# Altium footprint library devices.PCBLIB: 335 footprints (part 4 of 21)
Each footprint in its own frame and in the unit in brackets; x right, y up, seen from the top. Pads: shape width x height; smd on the part's side, far side on the other; paste and mask are expansions set on the pad; w line width, h text height; cw(c..) or ccw(c..) is an arc to the next point about the centre after c.
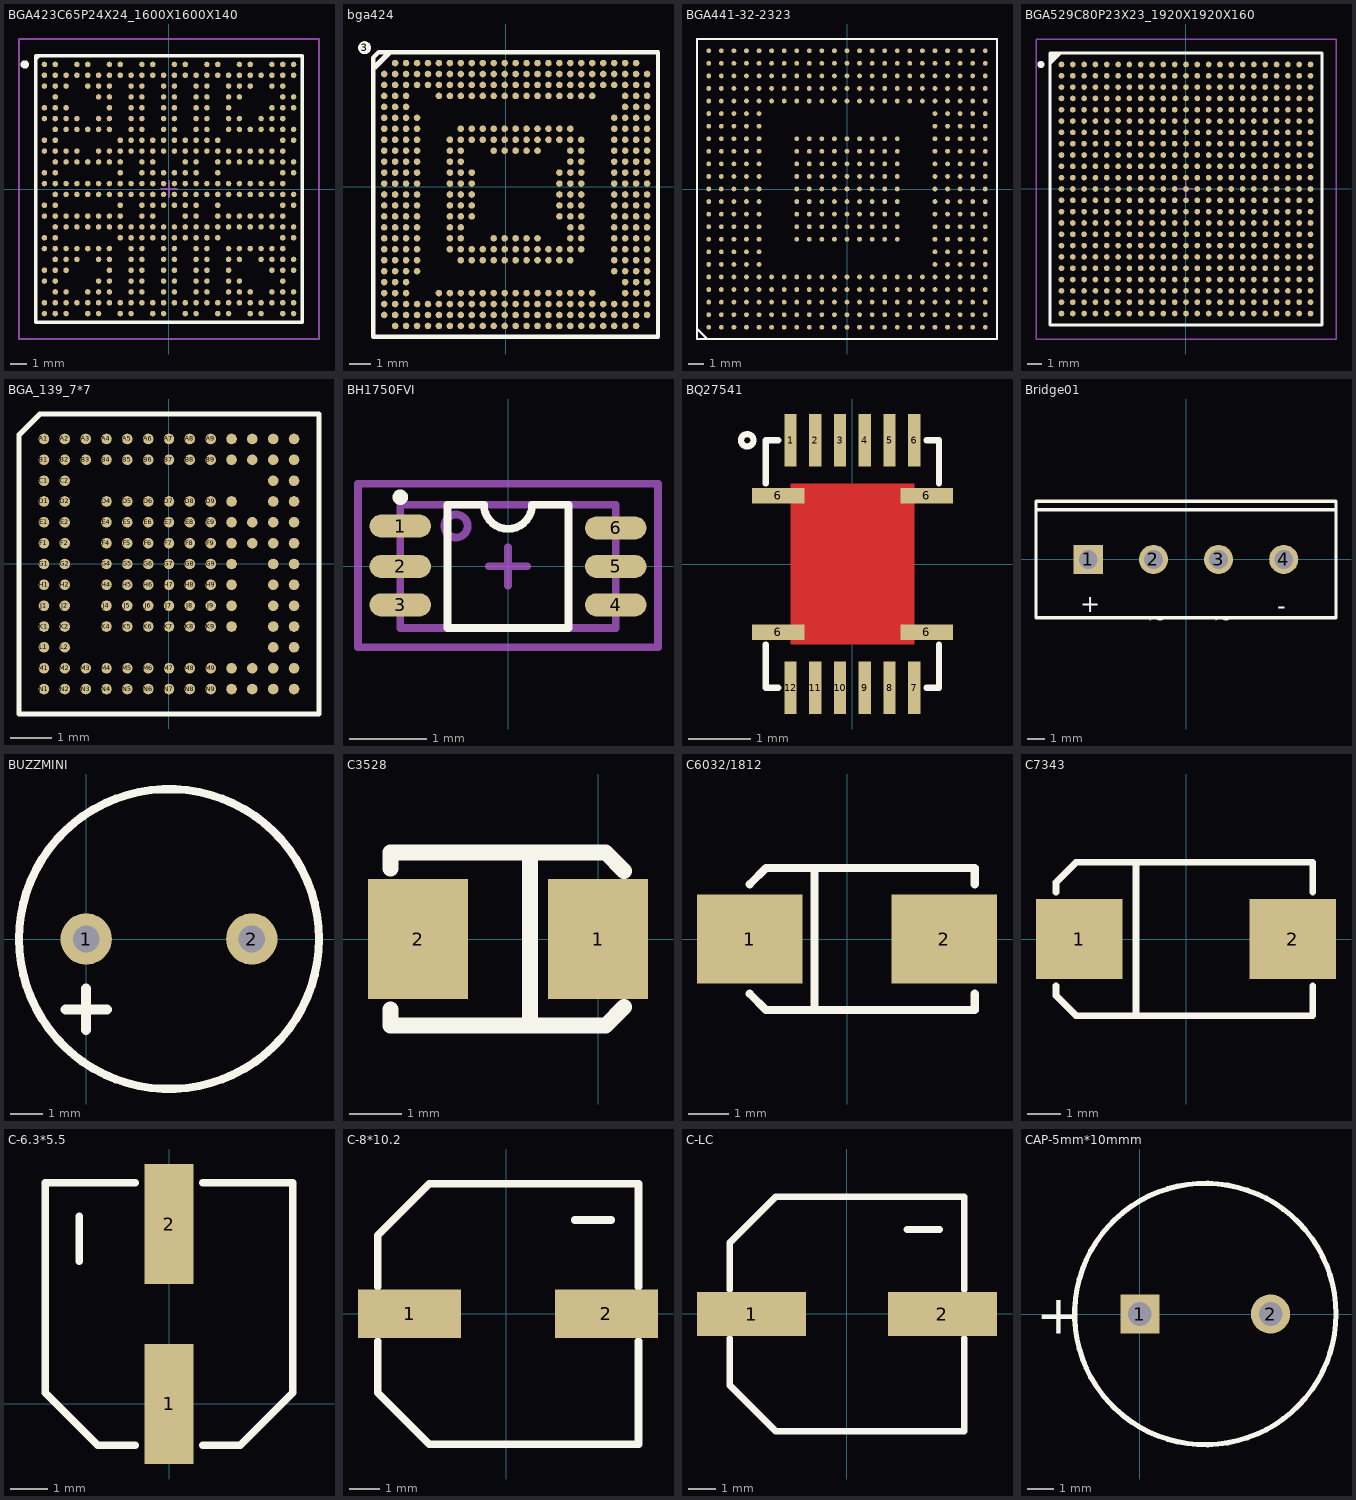
[diagram p3: the footprints below, top view; thin cyan lines are the x and y axes]

## BGA423C65P24X24_1600X1600X140 [mm] "BGA, 423-Leads, Body 16.0x16.0mm,  Pitch 0.65mm"
height 1.4
pads (423):
  round 0.33 smd: A1(-7.475,7.475) A2(-6.825,7.475) A4(-5.525,7.475) A5(-4.875,7.475) A7(-3.575,7.475) A8(-2.925,7.475) A10(-1.625,7.475) A11(-0.975,7.475) A13(0.325,7.475) A14(0.975,7.475) A16(2.275,7.475) A17(2.925,7.475) A19(4.225,7.475) A20(4.875,7.475) A22(6.175,7.475) A23(6.825,7.475) A24(7.475,7.475) AA1(-7.475,-5.525) AA2(-6.825,-5.525) AA6(-4.225,-5.525) AA7(-3.575,-5.525) AA9(-2.275,-5.525) AA10(-1.625,-5.525) AA12(-0.325,-5.525) AA13(0.325,-5.525) AA15(1.625,-5.525) AA16(2.275,-5.525) AA18(3.575,-5.525) AA19(4.225,-5.525) AA23(6.825,-5.525) AB2(-6.825,-6.175) AB3(-6.175,-6.175) AB5(-4.875,-6.175) AB6(-4.225,-6.175) AB7(-3.575,-6.175) AB9(-2.275,-6.175) AB10(-1.625,-6.175) AB12(-0.325,-6.175) AB13(0.325,-6.175) AB15(1.625,-6.175) AB16(2.275,-6.175) AB18(3.575,-6.175) AB19(4.225,-6.175) AB20(4.875,-6.175) AB22(6.175,-6.175) AB23(6.825,-6.175) AB24(7.475,-6.175) AC1(-7.475,-6.825) AC2(-6.825,-6.825) AC3(-6.175,-6.825) AC4(-5.525,-6.825) AC5(-4.875,-6.825) AC6(-4.225,-6.825) AC7(-3.575,-6.825) AC8(-2.925,-6.825) AC9(-2.275,-6.825) AC10(-1.625,-6.825) AC11(-0.975,-6.825) AC12(-0.325,-6.825) AC13(0.325,-6.825) AC14(0.975,-6.825) AC15(1.625,-6.825) AC16(2.275,-6.825) AC17(2.925,-6.825) AC18(3.575,-6.825) AC19(4.225,-6.825) AC20(4.875,-6.825) AC21(5.525,-6.825) AC22(6.175,-6.825) AC23(6.825,-6.825) AC24(7.475,-6.825) AD1(-7.475,-7.475) AD2(-6.825,-7.475) AD3(-6.175,-7.475) AD5(-4.875,-7.475) AD6(-4.225,-7.475) AD8(-2.925,-7.475) AD9(-2.275,-7.475) AD11(-0.975,-7.475) AD12(-0.325,-7.475) AD14(0.975,-7.475) AD15(1.625,-7.475) AD17(2.925,-7.475) AD18(3.575,-7.475) AD20(4.875,-7.475) AD21(5.525,-7.475) AD23(6.825,-7.475) AD24(7.475,-7.475) B1(-7.475,6.825) B2(-6.825,6.825) B3(-6.175,6.825) B4(-5.525,6.825) B5(-4.875,6.825) B6(-4.225,6.825) B7(-3.575,6.825) B8(-2.925,6.825) B9(-2.275,6.825) B10(-1.625,6.825) B11(-0.975,6.825) B12(-0.325,6.825) B13(0.325,6.825) B14(0.975,6.825) B15(1.625,6.825) B16(2.275,6.825) B17(2.925,6.825) B18(3.575,6.825) B19(4.225,6.825) B20(4.875,6.825) B21(5.525,6.825) B22(6.175,6.825) B23(6.825,6.825) B24(7.475,6.825) C1(-7.475,6.175) C2(-6.825,6.175) C3(-6.175,6.175) C5(-4.875,6.175) C6(-4.225,6.175) C7(-3.575,6.175) C9(-2.275,6.175) C10(-1.625,6.175) C12(-0.325,6.175) C13(0.325,6.175) C15(1.625,6.175) C16(2.275,6.175) C18(3.575,6.175) C19(4.225,6.175) C20(4.875,6.175) C22(6.175,6.175) C23(6.825,6.175) D2(-6.825,5.525) D6(-4.225,5.525) D7(-3.575,5.525) D9(-2.275,5.525) D10(-1.625,5.525) D12(-0.325,5.525) D13(0.325,5.525) D15(1.625,5.525) D16(2.275,5.525) D18(3.575,5.525) D19(4.225,5.525) D23(6.825,5.525) D24(7.475,5.525) E1(-7.475,4.875) E2(-6.825,4.875) E3(-6.175,4.875) E7(-3.575,4.875) E9(-2.275,4.875) E10(-1.625,4.875) E12(-0.325,4.875) E13(0.325,4.875) E15(1.625,4.875) E16(2.275,4.875) E18(3.575,4.875) E22(6.175,4.875) E23(6.825,4.875) E24(7.475,4.875) F1(-7.475,4.225) F2(-6.825,4.225) F3(-6.175,4.225) F4(-5.525,4.225) F6(-4.225,4.225) F7(-3.575,4.225) F9(-2.275,4.225) F10(-1.625,4.225) F12(-0.325,4.225) F13(0.325,4.225) F15(1.625,4.225) F16(2.275,4.225) F18(3.575,4.225) F19(4.225,4.225) F21(5.525,4.225) F22(6.175,4.225) F23(6.825,4.225) G2(-6.825,3.575) G3(-6.175,3.575) G4(-5.525,3.575) G5(-4.875,3.575) G6(-4.225,3.575) G7(-3.575,3.575) G9(-2.275,3.575) G10(-1.625,3.575) G12(-0.325,3.575) G13(0.325,3.575) G15(1.625,3.575) G16(2.275,3.575) G18(3.575,3.575) G19(4.225,3.575) G20(4.875,3.575) G21(5.525,3.575) G22(6.175,3.575) G23(6.825,3.575) G24(7.475,3.575) H1(-7.475,2.925) H2(-6.825,2.925) H8(-2.925,2.925) H9(-2.275,2.925) H10(-1.625,2.925) H11(-0.975,2.925) H12(-0.325,2.925) H13(0.325,2.925) H14(0.975,2.925) H15(1.625,2.925) H16(2.275,2.925) H17(2.925,2.925) H23(6.825,2.925) H24(7.475,2.925) J1(-7.475,2.275) J2(-6.825,2.275) J3(-6.175,2.275) J4(-5.525,2.275) J6(-4.225,2.275) J7(-3.575,2.275) J8(-2.925,2.275) J9(-2.275,2.275) J10(-1.625,2.275) J11(-0.975,2.275) J12(-0.325,2.275) J13(0.325,2.275) J14(0.975,2.275) J15(1.625,2.275) J16(2.275,2.275) J17(2.925,2.275) J18(3.575,2.275) J19(4.225,2.275) J20(4.875,2.275) J21(5.525,2.275) J22(6.175,2.275) J23(6.825,2.275) K2(-6.825,1.625) K3(-6.175,1.625) K4(-5.525,1.625) K5(-4.875,1.625) K6(-4.225,1.625) K7(-3.575,1.625) K8(-2.925,1.625) K10(-1.625,1.625) K11(-0.975,1.625) K14(0.975,1.625) K15(1.625,1.625) K17(2.925,1.625) K18(3.575,1.625) K19(4.225,1.625) K20(4.875,1.625) K21(5.525,1.625) K22(6.175,1.625) K23(6.825,1.625) K24(7.475,1.625) L1(-7.475,0.975) L2(-6.825,0.975) L8(-2.925,0.975) L10(-1.625,0.975) L11(-0.975,0.975) L12(-0.325,0.975) L13(0.325,0.975) L14(0.975,0.975) L15(1.625,0.975) L17(2.925,0.975) L23(6.825,0.975) L24(7.475,0.975) M1(-7.475,0.325) M2(-6.825,0.325) M3(-6.175,0.325) M4(-5.525,0.325) M5(-4.875,0.325) M6(-4.225,0.325) M7(-3.575,0.325) M8(-2.925,0.325) M9(-2.275,0.325) M10(-1.625,0.325) M11(-0.975,0.325) M12(-0.325,0.325) M13(0.325,0.325) M14(0.975,0.325) M15(1.625,0.325) M16(2.275,0.325) M17(2.925,0.325) M18(3.575,0.325) M19(4.225,0.325) M20(4.875,0.325) M21(5.525,0.325) M22(6.175,0.325) M23(6.825,0.325) N2(-6.825,-0.325) N3(-6.175,-0.325) N4(-5.525,-0.325) N5(-4.875,-0.325) N6(-4.225,-0.325) N7(-3.575,-0.325) N8(-2.925,-0.325) N9(-2.275,-0.325) N10(-1.625,-0.325) N11(-0.975,-0.325) N12(-0.325,-0.325) N13(0.325,-0.325) N14(0.975,-0.325) N15(1.625,-0.325) N16(2.275,-0.325) N17(2.925,-0.325) N18(3.575,-0.325) N19(4.225,-0.325) N20(4.875,-0.325) N21(5.525,-0.325) N22(6.175,-0.325) N23(6.825,-0.325) N24(7.475,-0.325) P1(-7.475,-0.975) P2(-6.825,-0.975) P8(-2.925,-0.975) P10(-1.625,-0.975) P11(-0.975,-0.975) P12(-0.325,-0.975) P13(0.325,-0.975) P14(0.975,-0.975) P15(1.625,-0.975) P17(2.925,-0.975) P23(6.825,-0.975) P24(7.475,-0.975) R1(-7.475,-1.625) R2(-6.825,-1.625) R3(-6.175,-1.625) R4(-5.525,-1.625) R5(-4.875,-1.625) R6(-4.225,-1.625) R7(-3.575,-1.625) R8(-2.925,-1.625) R10(-1.625,-1.625) R11(-0.975,-1.625) R14(0.975,-1.625) R15(1.625,-1.625) R17(2.925,-1.625) R18(3.575,-1.625) R19(4.225,-1.625) R20(4.875,-1.625) R21(5.525,-1.625) R22(6.175,-1.625) R23(6.825,-1.625) T2(-6.825,-2.275) T3(-6.175,-2.275) T4(-5.525,-2.275) T5(-4.875,-2.275) T6(-4.225,-2.275) T7(-3.575,-2.275) T8(-2.925,-2.275) T9(-2.275,-2.275) T10(-1.625,-2.275) T11(-0.975,-2.275) T12(-0.325,-2.275) T13(0.325,-2.275) T14(0.975,-2.275) T15(1.625,-2.275) T16(2.275,-2.275) T17(2.925,-2.275) T18(3.575,-2.275) T19(4.225,-2.275) T20(4.875,-2.275) T21(5.525,-2.275) T22(6.175,-2.275) T23(6.825,-2.275) T24(7.475,-2.275) U1(-7.475,-2.925) U2(-6.825,-2.925) U8(-2.925,-2.925) U9(-2.275,-2.925) U10(-1.625,-2.925) U11(-0.975,-2.925) U12(-0.325,-2.925) U13(0.325,-2.925) U14(0.975,-2.925) U15(1.625,-2.925) U16(2.275,-2.925) U17(2.925,-2.925) U23(6.825,-2.925) U24(7.475,-2.925) V1(-7.475,-3.575) V2(-6.825,-3.575) V3(-6.175,-3.575) V4(-5.525,-3.575) V5(-4.875,-3.575) V6(-4.225,-3.575) V7(-3.575,-3.575) V9(-2.275,-3.575) V10(-1.625,-3.575) V12(-0.325,-3.575) V13(0.325,-3.575) V15(1.625,-3.575) V16(2.275,-3.575) V18(3.575,-3.575) V19(4.225,-3.575) V20(4.875,-3.575) V21(5.525,-3.575) V22(6.175,-3.575) V23(6.825,-3.575) W2(-6.825,-4.225) W3(-6.175,-4.225) W4(-5.525,-4.225) W6(-4.225,-4.225) W7(-3.575,-4.225) W9(-2.275,-4.225) W10(-1.625,-4.225) W12(-0.325,-4.225) W13(0.325,-4.225) W15(1.625,-4.225) W16(2.275,-4.225) W18(3.575,-4.225) W19(4.225,-4.225) W21(5.525,-4.225) W22(6.175,-4.225) W23(6.825,-4.225) W24(7.475,-4.225) Y1(-7.475,-4.875) Y2(-6.825,-4.875) Y3(-6.175,-4.875) Y7(-3.575,-4.875) Y9(-2.275,-4.875) Y10(-1.625,-4.875) Y12(-0.325,-4.875) Y13(0.325,-4.875) Y15(1.625,-4.875) Y16(2.275,-4.875) Y18(3.575,-4.875) Y22(6.175,-4.875) Y23(6.825,-4.875) Y24(7.475,-4.875)
Top Overlay:
  circle w0.25: c-8.65,7.475 r0.125
  region: -7.799,8 -8,7.799 -8,8
  lines w0.2: -8,7.799 -7.799,8 ; -8,-8 -8,8 8,8 8,-8 -8,-8
Mechanical 13:
  lines w0.1: -8,-8 -8,8 8,8 8,-8 -8,-8
Mechanical 15:
  lines w0.1: -0.5,0 0.5,0 ; 0,-0.5 0,0.5 ; -9,-9 -9,9 9,9 9,-9 -9,-9
3D body: height 1.4, standoff 0.27, extent -8,-8 8,8

## bga424 [mm]
pads (425):
  round 0.6 on Top Overlay: 3(-6.447,6.351)
  round 0.3 smd: A2(-5.053,5.649) A3(-4.553,5.649) A4(-4.053,5.649) A5(-3.553,5.649) A6(-3.053,5.649) A7(-2.553,5.649) A8(-2.053,5.649) A9(-1.553,5.649) A10(-1.053,5.649) A11(-0.553,5.649) A12(-0.053,5.649) A13(0.447,5.649) A14(0.947,5.649) A15(1.447,5.649) A16(1.947,5.649) A17(2.447,5.649) A18(2.947,5.649) A19(3.447,5.649) A20(3.947,5.649) A21(4.447,5.649) A22(4.947,5.649) A23(5.447,5.649) A24(5.947,5.649) AA1(-5.553,-4.351) AA2(-5.053,-4.351) AA3(-4.553,-4.351) AA23(5.447,-4.351) AA24(5.947,-4.351) AA25(6.447,-4.351) AB1(-5.553,-4.851) AB2(-5.053,-4.851) AB3(-4.553,-4.851) AB6(-3.053,-4.851) AB7(-2.553,-4.851) AB8(-2.053,-4.851) AB9(-1.553,-4.851) AB10(-1.053,-4.851) AB11(-0.553,-4.851) AB12(-0.053,-4.851) AB13(0.447,-4.851) AB14(0.947,-4.851) AB15(1.447,-4.851) AB16(1.947,-4.851) AB17(2.447,-4.851) AB18(2.947,-4.851) AB19(3.447,-4.851) AB20(3.947,-4.851) AB23(5.447,-4.851) AB24(5.947,-4.851) AB25(6.447,-4.851) AC1(-5.553,-5.351) AC2(-5.053,-5.351) AC3(-4.553,-5.351) AC4(-4.053,-5.351) AC5(-3.553,-5.351) AC6(-3.053,-5.351) AC7(-2.553,-5.351) AC8(-2.053,-5.351) AC9(-1.553,-5.351) AC10(-1.053,-5.351) AC11(-0.553,-5.351) AC12(-0.053,-5.351) AC13(0.447,-5.351) AC14(0.947,-5.351) AC15(1.447,-5.351) AC16(1.947,-5.351) AC17(2.447,-5.351) AC18(2.947,-5.351) AC19(3.447,-5.351) AC20(3.947,-5.351) AC21(4.447,-5.351) AC22(4.947,-5.351) AC23(5.447,-5.351) AC24(5.947,-5.351) AC25(6.447,-5.351) AD1(-5.553,-5.851) AD2(-5.053,-5.851) AD3(-4.553,-5.851) AD4(-4.053,-5.851) AD5(-3.553,-5.851) AD6(-3.053,-5.851) AD7(-2.553,-5.851) AD8(-2.053,-5.851) AD9(-1.553,-5.851) AD10(-1.053,-5.851) AD11(-0.553,-5.851) AD12(-0.053,-5.851) AD13(0.447,-5.851) AD14(0.947,-5.851) AD15(1.447,-5.851) AD16(1.947,-5.851) AD17(2.447,-5.851) AD18(2.947,-5.851) AD19(3.447,-5.851) AD20(3.947,-5.851) AD21(4.447,-5.851) AD22(4.947,-5.851) AD23(5.447,-5.851) AD24(5.947,-5.851) AD25(6.447,-5.851) AE2(-5.053,-6.351) AE3(-4.553,-6.351) AE4(-4.053,-6.351) AE5(-3.553,-6.351) AE6(-3.053,-6.351) AE7(-2.553,-6.351) AE8(-2.053,-6.351) AE9(-1.553,-6.351) AE10(-1.053,-6.351) AE11(-0.553,-6.351) AE12(-0.053,-6.351) AE13(0.447,-6.351) AE14(0.947,-6.351) AE15(1.447,-6.351) AE16(1.947,-6.351) AE17(2.447,-6.351) AE18(2.947,-6.351) AE19(3.447,-6.351) AE20(3.947,-6.351) AE21(4.447,-6.351) AE22(4.947,-6.351) AE23(5.447,-6.351) AE24(5.947,-6.351) B1(-5.553,5.149) B2(-5.053,5.149) B3(-4.553,5.149) B4(-4.053,5.149) B5(-3.553,5.149) B6(-3.053,5.149) B7(-2.553,5.149) B8(-2.053,5.149) B9(-1.553,5.149) B10(-1.053,5.149) B11(-0.553,5.149) B12(-0.053,5.149) B13(0.447,5.149) B14(0.947,5.149) B15(1.447,5.149) B16(1.947,5.149) B17(2.447,5.149) B18(2.947,5.149) B19(3.447,5.149) B20(3.947,5.149) B21(4.447,5.149) B22(4.947,5.149) B23(5.447,5.149) B24(5.947,5.149) B25(6.447,5.149) C1(-5.553,4.649) C2(-5.053,4.649) C3(-4.553,4.649) C4(-4.053,4.649) C5(-3.553,4.649) C6(-3.053,4.649) C7(-2.553,4.649) C8(-2.053,4.649) C9(-1.553,4.649) C10(-1.053,4.649) C11(-0.553,4.649) C12(-0.053,4.649) C13(0.447,4.649) C14(0.947,4.649) C15(1.447,4.649) C16(1.947,4.649) C17(2.447,4.649) C18(2.947,4.649) C19(3.447,4.649) C20(3.947,4.649) C21(4.447,4.649) C22(4.947,4.649) C23(5.447,4.649) C24(5.947,4.649) C25(6.447,4.649) D1(-5.553,4.149) D2(-5.053,4.149) D3(-4.553,4.149) D6(-3.053,4.149) D7(-2.553,4.149) D8(-2.053,4.149) D9(-1.553,4.149) D10(-1.053,4.149) D11(-0.553,4.149) D12(-0.053,4.149) D13(0.447,4.149) D14(0.947,4.149) D15(1.447,4.149) D16(1.947,4.149) D17(2.447,4.149) D18(2.947,4.149) D19(3.447,4.149) D20(3.947,4.149) D23(5.447,4.149) D24(5.947,4.149) D25(6.447,4.149) E1(-5.553,3.649) E2(-5.053,3.649) E3(-4.553,3.649) E23(5.447,3.649) E24(5.947,3.649) E25(6.447,3.649) F1(-5.553,3.149) F2(-5.053,3.149) F3(-4.553,3.149) F4(-4.053,3.149) F22(4.947,3.149) F23(5.447,3.149) F24(5.947,3.149) F25(6.447,3.149) G1(-5.553,2.649) G2(-5.053,2.649) G3(-4.553,2.649) G4(-4.053,2.649) G8(-2.053,2.649) G9(-1.553,2.649) G10(-1.053,2.649) G11(-0.553,2.649) G12(-0.053,2.649) G13(0.447,2.649) G14(0.947,2.649) G15(1.447,2.649) G16(1.947,2.649) G17(2.447,2.649) G18(2.947,2.649) G22(4.947,2.649) G23(5.447,2.649) G24(5.947,2.649) G25(6.447,2.649) H1(-5.553,2.149) H2(-5.053,2.149) H3(-4.553,2.149) H4(-4.053,2.149) H7(-2.553,2.149) H8(-2.053,2.149) H9(-1.553,2.149) H10(-1.053,2.149) H11(-0.553,2.149) H12(-0.053,2.149) H13(0.447,2.149) H14(0.947,2.149) H15(1.447,2.149) H16(1.947,2.149) H17(2.447,2.149) H18(2.947,2.149) H19(3.447,2.149) H22(4.947,2.149) H23(5.447,2.149) H24(5.947,2.149) H25(6.447,2.149) J1(-5.553,1.649) J2(-5.053,1.649) J3(-4.553,1.649) J4(-4.053,1.649) J7(-2.553,1.649) J8(-2.053,1.649) J11(-0.553,1.649) J12(-0.053,1.649) J13(0.447,1.649) J14(0.947,1.649) J15(1.447,1.649) J18(2.947,1.649) J19(3.447,1.649) J22(4.947,1.649) J23(5.447,1.649) J24(5.947,1.649) J25(6.447,1.649) K1(-5.553,1.149) K2(-5.053,1.149) K3(-4.553,1.149) K4(-4.053,1.149) K7(-2.553,1.149) K8(-2.053,1.149) K18(2.947,1.149) K19(3.447,1.149) K22(4.947,1.149) K23(5.447,1.149) K24(5.947,1.149) K25(6.447,1.149) L1(-5.553,0.649) L2(-5.053,0.649) L3(-4.553,0.649) L4(-4.053,0.649) L7(-2.553,0.649) L8(-2.053,0.649) L9(-1.553,0.649) L17(2.447,0.649) L18(2.947,0.649) L19(3.447,0.649) L22(4.947,0.649) L23(5.447,0.649) L24(5.947,0.649) L25(6.447,0.649) M1(-5.553,0.149) M2(-5.053,0.149) M3(-4.553,0.149) M4(-4.053,0.149) M7(-2.553,0.149) M8(-2.053,0.149) M9(-1.553,0.149) M17(2.447,0.149) M18(2.947,0.149) M19(3.447,0.149) M22(4.947,0.149) M23(5.447,0.149) M24(5.947,0.149) M25(6.447,0.149) N1(-5.553,-0.351) N2(-5.053,-0.351) N3(-4.553,-0.351) N4(-4.053,-0.351) N7(-2.553,-0.351) N8(-2.053,-0.351) N9(-1.553,-0.351) N17(2.447,-0.351) N18(2.947,-0.351) N19(3.447,-0.351) N22(4.947,-0.351) N23(5.447,-0.351) N24(5.947,-0.351) N25(6.447,-0.351) P1(-5.553,-0.851) P2(-5.053,-0.851) P3(-4.553,-0.851) P4(-4.053,-0.851) P7(-2.553,-0.851) P8(-2.053,-0.851) P9(-1.553,-0.851) P17(2.447,-0.851) P18(2.947,-0.851) P19(3.447,-0.851) P22(4.947,-0.851) P23(5.447,-0.851) P24(5.947,-0.851) P25(6.447,-0.851) R1(-5.553,-1.351) R2(-5.053,-1.351) R3(-4.553,-1.351) R4(-4.053,-1.351) R7(-2.553,-1.351) R8(-2.053,-1.351) R9(-1.553,-1.351) R17(2.447,-1.351) R18(2.947,-1.351) R19(3.447,-1.351) R22(4.947,-1.351) R23(5.447,-1.351) R24(5.947,-1.351) R25(6.447,-1.351) T1(-5.553,-1.851) T2(-5.053,-1.851) T3(-4.553,-1.851) T4(-4.053,-1.851) T7(-2.553,-1.851) T8(-2.053,-1.851) T18(2.947,-1.851) T19(3.447,-1.851) T22(4.947,-1.851) T23(5.447,-1.851) T24(5.947,-1.851) T25(6.447,-1.851) U1(-5.553,-2.351) U2(-5.053,-2.351) U3(-4.553,-2.351) U4(-4.053,-2.351) U7(-2.553,-2.351) U8(-2.053,-2.351) U11(-0.553,-2.351) U12(-0.053,-2.351) U13(0.447,-2.351) U14(0.947,-2.351) U15(1.447,-2.351) U18(2.947,-2.351) U19(3.447,-2.351) U22(4.947,-2.351) U23(5.447,-2.351) U24(5.947,-2.351) U25(6.447,-2.351) V1(-5.553,-2.851) V2(-5.053,-2.851) V3(-4.553,-2.851) V4(-4.053,-2.851) V7(-2.553,-2.851) V8(-2.053,-2.851) V9(-1.553,-2.851) V10(-1.053,-2.851) V11(-0.553,-2.851) V12(-0.053,-2.851) V13(0.447,-2.851) V14(0.947,-2.851) V15(1.447,-2.851) V16(1.947,-2.851) V17(2.447,-2.851) V18(2.947,-2.851) V19(3.447,-2.851) V22(4.947,-2.851) V23(5.447,-2.851) V24(5.947,-2.851) V25(6.447,-2.851) W1(-5.553,-3.351) W2(-5.053,-3.351) W3(-4.553,-3.351) W4(-4.053,-3.351) W8(-2.053,-3.351) W9(-1.553,-3.351) W10(-1.053,-3.351) W11(-0.553,-3.351) W12(-0.053,-3.351) W13(0.447,-3.351) W14(0.947,-3.351) W15(1.447,-3.351) W16(1.947,-3.351) W17(2.447,-3.351) W18(2.947,-3.351) W22(4.947,-3.351) W23(5.447,-3.351) W24(5.947,-3.351) W25(6.447,-3.351) Y1(-5.553,-3.851) Y2(-5.053,-3.851) Y3(-4.553,-3.851) Y4(-4.053,-3.851) Y22(4.947,-3.851) Y23(5.447,-3.851) Y24(5.947,-3.851) Y25(6.447,-3.851)
Top Overlay:
  lines w0.2: -6.053,-6.851 6.947,-6.851 6.947,6.149 -5.803,6.149 -6.053,5.899 -6.053,-6.851
  lines w0.254: -5.997,5.451 -5.334,6.113

## BGA441-32-2323 [mil] "BGA441-32-2323"
pads (441):
  round 12 smd: A1(-346.46,-346.46) A2(-346.46,-314.96) A3(-346.46,-283.46) A4(-346.46,-251.97) A5(-346.46,-220.47) A6(-346.46,-188.98) A7(-346.46,-157.48) A8(-346.46,-125.98) A9(-346.46,-94.49) A10(-346.46,-62.99) A11(-346.46,-31.5) A12(-346.46,0) A13(-346.46,31.5) A14(-346.46,62.99) A15(-346.46,94.49) A16(-346.46,125.98) A17(-346.46,157.48) A18(-346.46,188.98) A19(-346.46,220.47) A20(-346.46,251.97) A21(-346.46,283.46) A22(-346.46,314.96) A23(-346.46,346.46) AA1(283.46,-346.46) AA2(283.46,-314.96) AA3(283.46,-283.46) AA4(283.46,-251.97) AA5(283.46,-220.47) AA6(283.46,-188.98) AA7(283.46,-157.48) AA8(283.46,-125.98) AA9(283.46,-94.49) AA10(283.46,-62.99) AA11(283.46,-31.5) AA12(283.46,0) AA13(283.46,31.5) AA14(283.46,62.99) AA15(283.46,94.49) AA16(283.46,125.98) AA17(283.46,157.48) AA18(283.46,188.98) AA19(283.46,220.47) AA20(283.46,251.97) AA21(283.46,283.46) AA22(283.46,314.96) AA23(283.46,346.46) AB1(314.96,-346.46) AB2(314.96,-314.96) AB3(314.96,-283.46) AB4(314.96,-251.97) AB5(314.96,-220.47) AB6(314.96,-188.98) AB7(314.96,-157.48) AB8(314.96,-125.98) AB9(314.96,-94.49) AB10(314.96,-62.99) AB11(314.96,-31.5) AB12(314.96,0) AB13(314.96,31.5) AB14(314.96,62.99) AB15(314.96,94.49) AB16(314.96,125.98) AB17(314.96,157.48) AB18(314.96,188.98) AB19(314.96,220.47) AB20(314.96,251.97) AB21(314.96,283.46) AB22(314.96,314.96) AB23(314.96,346.46) AC1(346.46,-346.46) AC2(346.46,-314.96) AC3(346.46,-283.46) AC4(346.46,-251.97) AC5(346.46,-220.47) AC6(346.46,-188.98) AC7(346.46,-157.48) AC8(346.46,-125.98) AC9(346.46,-94.49) AC10(346.46,-62.99) AC11(346.46,-31.5) AC12(346.46,0) AC13(346.46,31.5) AC14(346.46,62.99) AC15(346.46,94.49) AC16(346.46,125.98) AC17(346.46,157.48) AC18(346.46,188.98) AC19(346.46,220.47) AC20(346.46,251.97) AC21(346.46,283.46) AC22(346.46,314.96) AC23(346.46,346.46) B1(-314.96,-346.46) B2(-314.96,-314.96) B3(-314.96,-283.46) B4(-314.96,-251.97) B5(-314.96,-220.47) B6(-314.96,-188.98) B7(-314.96,-157.48) B8(-314.96,-125.98) B9(-314.96,-94.49) B10(-314.96,-62.99) B11(-314.96,-31.5) B12(-314.96,0) B13(-314.96,31.5) B14(-314.96,62.99) B15(-314.96,94.49) B16(-314.96,125.98) B17(-314.96,157.48) B18(-314.96,188.98) B19(-314.96,220.47) B20(-314.96,251.97) B21(-314.96,283.46) B22(-314.96,314.96) B23(-314.96,346.46) C1(-283.46,-346.46) C2(-283.46,-314.96) C3(-283.46,-283.46) C4(-283.46,-251.97) C5(-283.46,-220.47) C6(-283.46,-188.98) C7(-283.46,-157.48) C8(-283.46,-125.98) C9(-283.46,-94.49) C10(-283.46,-62.99) C11(-283.46,-31.5) C12(-283.46,0) C13(-283.46,31.5) C14(-283.46,62.99) C15(-283.46,94.49) C16(-283.46,125.98) C17(-283.46,157.48) C18(-283.46,188.98) C19(-283.46,220.47) C20(-283.46,251.97) C21(-283.46,283.46) C22(-283.46,314.96) C23(-283.46,346.46) D1(-251.97,-346.46) D2(-251.97,-314.96) D3(-251.97,-283.46) D4(-251.97,-251.97) D5(-251.97,-220.47) D6(-251.97,-188.98) D7(-251.97,-157.48) D8(-251.97,-125.98) D9(-251.97,-94.49) D10(-251.97,-62.99) D11(-251.97,-31.5) D12(-251.97,0) D13(-251.97,31.5) D14(-251.97,62.99) D15(-251.97,94.49) D16(-251.97,125.98) D17(-251.97,157.48) D18(-251.97,188.98) D19(-251.97,220.47) D20(-251.97,251.97) D21(-251.97,283.46) D22(-251.97,314.96) D23(-251.97,346.46) E1(-220.47,-346.46) E2(-220.47,-314.96) E3(-220.47,-283.46) E4(-220.47,-251.97) E5(-220.47,-220.47) E6(-220.47,-188.98) E7(-220.47,-157.48) E8(-220.47,-125.98) E9(-220.47,-94.49) E10(-220.47,-62.99) E11(-220.47,-31.5) E12(-220.47,0) E13(-220.47,31.5) E14(-220.47,62.99) E15(-220.47,94.49) E16(-220.47,125.98) E17(-220.47,157.48) E18(-220.47,188.98) E19(-220.47,220.47) E20(-220.47,251.97) E21(-220.47,283.46) E22(-220.47,314.96) E23(-220.47,346.46) F1(-188.98,-346.46) F2(-188.98,-314.96) F3(-188.98,-283.46) F4(-188.98,-251.97) F5(-188.98,-220.47) F19(-188.98,220.47) F20(-188.98,251.97) F21(-188.98,283.46) F22(-188.98,314.96) F23(-188.98,346.46) G1(-157.48,-346.46) G2(-157.48,-314.96) G3(-157.48,-283.46) G4(-157.48,-251.97) G5(-157.48,-220.47) G19(-157.48,220.47) G20(-157.48,251.97) G21(-157.48,283.46) G22(-157.48,314.96) G23(-157.48,346.46) H1(-125.98,-346.46) H2(-125.98,-314.96) H3(-125.98,-283.46) H4(-125.98,-251.97) H5(-125.98,-220.47) H8(-125.98,-125.98) H9(-125.98,-94.49) H10(-125.98,-62.99) H11(-125.98,-31.5) H12(-125.98,0) H13(-125.98,31.5) H14(-125.98,62.99) H15(-125.98,94.49) H16(-125.98,125.98) H19(-125.98,220.47) H20(-125.98,251.97) H21(-125.98,283.46) H22(-125.98,314.96) H23(-125.98,346.46) J1(-94.49,-346.46) J2(-94.49,-314.96) J3(-94.49,-283.46) J4(-94.49,-251.97) J5(-94.49,-220.47) J8(-94.49,-125.98) J9(-94.49,-94.49) J10(-94.49,-62.99) J11(-94.49,-31.5) J12(-94.49,0) J13(-94.49,31.5) J14(-94.49,62.99) J15(-94.49,94.49) J16(-94.49,125.98) J19(-94.49,220.47) J20(-94.49,251.97) J21(-94.49,283.46) J22(-94.49,314.96) J23(-94.49,346.46) K1(-62.99,-346.46) K2(-62.99,-314.96) K3(-62.99,-283.46) K4(-62.99,-251.97) K5(-62.99,-220.47) K8(-62.99,-125.98) K9(-62.99,-94.49) K10(-62.99,-62.99) K11(-62.99,-31.5) K12(-62.99,0) K13(-62.99,31.5) K14(-62.99,62.99) K15(-62.99,94.49) K16(-62.99,125.98) K19(-62.99,220.47) K20(-62.99,251.97) K21(-62.99,283.46) K22(-62.99,314.96) K23(-62.99,346.46) L1(-31.5,-346.46) L2(-31.5,-314.96) L3(-31.5,-283.46) L4(-31.5,-251.97) L5(-31.5,-220.47) L8(-31.5,-125.98) L9(-31.5,-94.49) L10(-31.5,-62.99) L11(-31.5,-31.5) L12(-31.5,0) L13(-31.5,31.5) L14(-31.5,62.99) L15(-31.5,94.49) L16(-31.5,125.98) L19(-31.5,220.47) L20(-31.5,251.97) L21(-31.5,283.46) L22(-31.5,314.96) L23(-31.5,346.46) M1(0,-346.46) M2(0,-314.96) M3(0,-283.46) M4(0,-251.97) M5(0,-220.47) M8(0,-125.98) M9(0,-94.49) M10(0,-62.99) M11(0,-31.5) M12(0,0) M13(0,31.5) M14(0,62.99) M15(0,94.49) M16(0,125.98) M19(0,220.47) M20(0,251.97) M21(0,283.46) M22(0,314.96) M23(0,346.46) N1(31.5,-346.46) N2(31.5,-314.96) N3(31.5,-283.46) N4(31.5,-251.97) N5(31.5,-220.47) N8(31.5,-125.98) N9(31.5,-94.49) N10(31.5,-62.99) N11(31.5,-31.5) N12(31.5,0) N13(31.5,31.5) N14(31.5,62.99) N15(31.5,94.49) N16(31.5,125.98) N19(31.5,220.47) N20(31.5,251.97) N21(31.5,283.46) N22(31.5,314.96) N23(31.5,346.46) P1(62.99,-346.46) P2(62.99,-314.96) P3(62.99,-283.46) P4(62.99,-251.97) P5(62.99,-220.47) P8(62.99,-125.98) P9(62.99,-94.49) P10(62.99,-62.99) P11(62.99,-31.5) P12(62.99,0) P13(62.99,31.5) P14(62.99,62.99) P15(62.99,94.49) P16(62.99,125.98) P19(62.99,220.47) P20(62.99,251.97) P21(62.99,283.46) P22(62.99,314.96) P23(62.99,346.46) R1(94.49,-346.46) R2(94.49,-314.96) R3(94.49,-283.46) R4(94.49,-251.97) R5(94.49,-220.47) R8(94.49,-125.98) R9(94.49,-94.49) R10(94.49,-62.99) R11(94.49,-31.5) R12(94.49,0) R13(94.49,31.5) R14(94.49,62.99) R15(94.49,94.49) R16(94.49,125.98) R19(94.49,220.47) R20(94.49,251.97) R21(94.49,283.46) R22(94.49,314.96) R23(94.49,346.46) T1(125.98,-346.46) T2(125.98,-314.96) T3(125.98,-283.46) T4(125.98,-251.97) T5(125.98,-220.47) T8(125.98,-125.98) T9(125.98,-94.49) T10(125.98,-62.99) T11(125.98,-31.5) T12(125.98,0) T13(125.98,31.5) T14(125.98,62.99) T15(125.98,94.49) T16(125.98,125.98) T19(125.98,220.47) T20(125.98,251.97) T21(125.98,283.46) T22(125.98,314.96) T23(125.98,346.46) U1(157.48,-346.46) U2(157.48,-314.96) U3(157.48,-283.46) U4(157.48,-251.97) U5(157.48,-220.47) U19(157.48,220.47) U20(157.48,251.97) U21(157.48,283.46) U22(157.48,314.96) U23(157.48,346.46) V1(188.98,-346.46) V2(188.98,-314.96) V3(188.98,-283.46) V4(188.98,-251.97) V5(188.98,-220.47) V19(188.98,220.47) V20(188.98,251.97) V21(188.98,283.46) V22(188.98,314.96) V23(188.98,346.46) W1(220.47,-346.46) W2(220.47,-314.96) W3(220.47,-283.46) W4(220.47,-251.97) W5(220.47,-220.47) W6(220.47,-188.98) W7(220.47,-157.48) W8(220.47,-125.98) W9(220.47,-94.49) W10(220.47,-62.99) W11(220.47,-31.5) W12(220.47,0) W13(220.47,31.5) W14(220.47,62.99) W15(220.47,94.49) W16(220.47,125.98) W17(220.47,157.48) W18(220.47,188.98) W19(220.47,220.47) W20(220.47,251.97) W21(220.47,283.46) W22(220.47,314.96) W23(220.47,346.46) Y1(251.97,-346.46) Y2(251.97,-314.96) Y3(251.97,-283.46) Y4(251.97,-251.97) Y5(251.97,-220.47) Y6(251.97,-188.98) Y7(251.97,-157.48) Y8(251.97,-125.98) Y9(251.97,-94.49) Y10(251.97,-62.99) Y11(251.97,-31.5) Y12(251.97,0) Y13(251.97,31.5) Y14(251.97,62.99) Y15(251.97,94.49) Y16(251.97,125.98) Y17(251.97,157.48) Y18(251.97,188.98) Y19(251.97,220.47) Y20(251.97,251.97) Y21(251.97,283.46) Y22(251.97,314.96) Y23(251.97,346.46)
Top Overlay:
  lines w6: -375.98,-350.39 -350.39,-375.98 ; -375.98,-375.98 375.98,-375.98 375.98,375.98 -375.98,375.98 -375.98,-375.98
Mechanical 11:
  lines w6: -375.98,-375.98 -375.98,375.98 375.98,375.98 375.98,-375.98 -375.98,-375.98

## BGA529C80P23X23_1920X1920X160 [mm] "BGA, 529-Leads, Body 19.2x19.2mm,  Pitch 0.80mm"
height 1.6
pads (529):
  round 0.4 smd: A1(-8.8,8.8) A2(-8,8.8) A3(-7.2,8.8) A4(-6.4,8.8) A5(-5.6,8.8) A6(-4.8,8.8) A7(-4,8.8) A8(-3.2,8.8) A9(-2.4,8.8) A10(-1.6,8.8) A11(-0.8,8.8) A12(0,8.8) A13(0.8,8.8) A14(1.6,8.8) A15(2.4,8.8) A16(3.2,8.8) A17(4,8.8) A18(4.8,8.8) A19(5.6,8.8) A20(6.4,8.8) A21(7.2,8.8) A22(8,8.8) A23(8.8,8.8) AA1(-8.8,-7.2) AA2(-8,-7.2) AA3(-7.2,-7.2) AA4(-6.4,-7.2) AA5(-5.6,-7.2) AA6(-4.8,-7.2) AA7(-4,-7.2) AA8(-3.2,-7.2) AA9(-2.4,-7.2) AA10(-1.6,-7.2) AA11(-0.8,-7.2) AA12(0,-7.2) AA13(0.8,-7.2) AA14(1.6,-7.2) AA15(2.4,-7.2) AA16(3.2,-7.2) AA17(4,-7.2) AA18(4.8,-7.2) AA19(5.6,-7.2) AA20(6.4,-7.2) AA21(7.2,-7.2) AA22(8,-7.2) AA23(8.8,-7.2) AB1(-8.8,-8) AB2(-8,-8) AB3(-7.2,-8) AB4(-6.4,-8) AB5(-5.6,-8) AB6(-4.8,-8) AB7(-4,-8) AB8(-3.2,-8) AB9(-2.4,-8) AB10(-1.6,-8) AB11(-0.8,-8) AB12(0,-8) AB13(0.8,-8) AB14(1.6,-8) AB15(2.4,-8) AB16(3.2,-8) AB17(4,-8) AB18(4.8,-8) AB19(5.6,-8) AB20(6.4,-8) AB21(7.2,-8) AB22(8,-8) AB23(8.8,-8) AC1(-8.8,-8.8) AC2(-8,-8.8) AC3(-7.2,-8.8) AC4(-6.4,-8.8) AC5(-5.6,-8.8) AC6(-4.8,-8.8) AC7(-4,-8.8) AC8(-3.2,-8.8) AC9(-2.4,-8.8) AC10(-1.6,-8.8) AC11(-0.8,-8.8) AC12(0,-8.8) AC13(0.8,-8.8) AC14(1.6,-8.8) AC15(2.4,-8.8) AC16(3.2,-8.8) AC17(4,-8.8) AC18(4.8,-8.8) AC19(5.6,-8.8) AC20(6.4,-8.8) AC21(7.2,-8.8) AC22(8,-8.8) AC23(8.8,-8.8) B1(-8.8,8) B2(-8,8) B3(-7.2,8) B4(-6.4,8) B5(-5.6,8) B6(-4.8,8) B7(-4,8) B8(-3.2,8) B9(-2.4,8) B10(-1.6,8) B11(-0.8,8) B12(0,8) B13(0.8,8) B14(1.6,8) B15(2.4,8) B16(3.2,8) B17(4,8) B18(4.8,8) B19(5.6,8) B20(6.4,8) B21(7.2,8) B22(8,8) B23(8.8,8) C1(-8.8,7.2) C2(-8,7.2) C3(-7.2,7.2) C4(-6.4,7.2) C5(-5.6,7.2) C6(-4.8,7.2) C7(-4,7.2) C8(-3.2,7.2) C9(-2.4,7.2) C10(-1.6,7.2) C11(-0.8,7.2) C12(0,7.2) C13(0.8,7.2) C14(1.6,7.2) C15(2.4,7.2) C16(3.2,7.2) C17(4,7.2) C18(4.8,7.2) C19(5.6,7.2) C20(6.4,7.2) C21(7.2,7.2) C22(8,7.2) C23(8.8,7.2) D1(-8.8,6.4) D2(-8,6.4) D3(-7.2,6.4) D4(-6.4,6.4) D5(-5.6,6.4) D6(-4.8,6.4) D7(-4,6.4) D8(-3.2,6.4) D9(-2.4,6.4) D10(-1.6,6.4) D11(-0.8,6.4) D12(0,6.4) D13(0.8,6.4) D14(1.6,6.4) D15(2.4,6.4) D16(3.2,6.4) D17(4,6.4) D18(4.8,6.4) D19(5.6,6.4) D20(6.4,6.4) D21(7.2,6.4) D22(8,6.4) D23(8.8,6.4) E1(-8.8,5.6) E2(-8,5.6) E3(-7.2,5.6) E4(-6.4,5.6) E5(-5.6,5.6) E6(-4.8,5.6) E7(-4,5.6) E8(-3.2,5.6) E9(-2.4,5.6) E10(-1.6,5.6) E11(-0.8,5.6) E12(0,5.6) E13(0.8,5.6) E14(1.6,5.6) E15(2.4,5.6) E16(3.2,5.6) E17(4,5.6) E18(4.8,5.6) E19(5.6,5.6) E20(6.4,5.6) E21(7.2,5.6) E22(8,5.6) E23(8.8,5.6) F1(-8.8,4.8) F2(-8,4.8) F3(-7.2,4.8) F4(-6.4,4.8) F5(-5.6,4.8) F6(-4.8,4.8) F7(-4,4.8) F8(-3.2,4.8) F9(-2.4,4.8) F10(-1.6,4.8) F11(-0.8,4.8) F12(0,4.8) F13(0.8,4.8) F14(1.6,4.8) F15(2.4,4.8) F16(3.2,4.8) F17(4,4.8) F18(4.8,4.8) F19(5.6,4.8) F20(6.4,4.8) F21(7.2,4.8) F22(8,4.8) F23(8.8,4.8) G1(-8.8,4) G2(-8,4) G3(-7.2,4) G4(-6.4,4) G5(-5.6,4) G6(-4.8,4) G7(-4,4) G8(-3.2,4) G9(-2.4,4) G10(-1.6,4) G11(-0.8,4) G12(0,4) G13(0.8,4) G14(1.6,4) G15(2.4,4) G16(3.2,4) G17(4,4) G18(4.8,4) G19(5.6,4) G20(6.4,4) G21(7.2,4) G22(8,4) G23(8.8,4) H1(-8.8,3.2) H2(-8,3.2) H3(-7.2,3.2) H4(-6.4,3.2) H5(-5.6,3.2) H6(-4.8,3.2) H7(-4,3.2) H8(-3.2,3.2) H9(-2.4,3.2) H10(-1.6,3.2) H11(-0.8,3.2) H12(0,3.2) H13(0.8,3.2) H14(1.6,3.2) H15(2.4,3.2) H16(3.2,3.2) H17(4,3.2) H18(4.8,3.2) H19(5.6,3.2) H20(6.4,3.2) H21(7.2,3.2) H22(8,3.2) H23(8.8,3.2) J1(-8.8,2.4) J2(-8,2.4) J3(-7.2,2.4) J4(-6.4,2.4) J5(-5.6,2.4) J6(-4.8,2.4) J7(-4,2.4) J8(-3.2,2.4) J9(-2.4,2.4) J10(-1.6,2.4) J11(-0.8,2.4) J12(0,2.4) J13(0.8,2.4) J14(1.6,2.4) J15(2.4,2.4) J16(3.2,2.4) J17(4,2.4) J18(4.8,2.4) J19(5.6,2.4) J20(6.4,2.4) J21(7.2,2.4) J22(8,2.4) J23(8.8,2.4) K1(-8.8,1.6) K2(-8,1.6) K3(-7.2,1.6) K4(-6.4,1.6) K5(-5.6,1.6) K6(-4.8,1.6) K7(-4,1.6) K8(-3.2,1.6) K9(-2.4,1.6) K10(-1.6,1.6) K11(-0.8,1.6) K12(0,1.6) K13(0.8,1.6) K14(1.6,1.6) K15(2.4,1.6) K16(3.2,1.6) K17(4,1.6) K18(4.8,1.6) K19(5.6,1.6) K20(6.4,1.6) K21(7.2,1.6) K22(8,1.6) K23(8.8,1.6) L1(-8.8,0.8) L2(-8,0.8) L3(-7.2,0.8) L4(-6.4,0.8) L5(-5.6,0.8) L6(-4.8,0.8) L7(-4,0.8) L8(-3.2,0.8) L9(-2.4,0.8) L10(-1.6,0.8) L11(-0.8,0.8) L12(0,0.8) L13(0.8,0.8) L14(1.6,0.8) L15(2.4,0.8) L16(3.2,0.8) L17(4,0.8) L18(4.8,0.8) L19(5.6,0.8) L20(6.4,0.8) L21(7.2,0.8) L22(8,0.8) L23(8.8,0.8) M1(-8.8,0) M2(-8,0) M3(-7.2,0) M4(-6.4,0) M5(-5.6,0) M6(-4.8,0) M7(-4,0) M8(-3.2,0) M9(-2.4,0) M10(-1.6,0) M11(-0.8,0) M12(0,0) M13(0.8,0) M14(1.6,0) M15(2.4,0) M16(3.2,0) M17(4,0) M18(4.8,0) M19(5.6,0) M20(6.4,0) M21(7.2,0) M22(8,0) M23(8.8,0) N1(-8.8,-0.8) N2(-8,-0.8) N3(-7.2,-0.8) N4(-6.4,-0.8) N5(-5.6,-0.8) N6(-4.8,-0.8) N7(-4,-0.8) N8(-3.2,-0.8) N9(-2.4,-0.8) N10(-1.6,-0.8) N11(-0.8,-0.8) N12(0,-0.8) N13(0.8,-0.8) N14(1.6,-0.8) N15(2.4,-0.8) N16(3.2,-0.8) N17(4,-0.8) N18(4.8,-0.8) N19(5.6,-0.8) N20(6.4,-0.8) N21(7.2,-0.8) N22(8,-0.8) N23(8.8,-0.8) P1(-8.8,-1.6) P2(-8,-1.6) P3(-7.2,-1.6) P4(-6.4,-1.6) P5(-5.6,-1.6) P6(-4.8,-1.6) P7(-4,-1.6) P8(-3.2,-1.6) P9(-2.4,-1.6) P10(-1.6,-1.6) P11(-0.8,-1.6) P12(0,-1.6) P13(0.8,-1.6) P14(1.6,-1.6) P15(2.4,-1.6) P16(3.2,-1.6) P17(4,-1.6) P18(4.8,-1.6) P19(5.6,-1.6) P20(6.4,-1.6) P21(7.2,-1.6) P22(8,-1.6) P23(8.8,-1.6) R1(-8.8,-2.4) R2(-8,-2.4) R3(-7.2,-2.4) R4(-6.4,-2.4) R5(-5.6,-2.4) R6(-4.8,-2.4) R7(-4,-2.4) R8(-3.2,-2.4) R9(-2.4,-2.4) R10(-1.6,-2.4) R11(-0.8,-2.4) R12(0,-2.4) R13(0.8,-2.4) R14(1.6,-2.4) R15(2.4,-2.4) R16(3.2,-2.4) R17(4,-2.4) R18(4.8,-2.4) R19(5.6,-2.4) R20(6.4,-2.4) R21(7.2,-2.4) R22(8,-2.4) R23(8.8,-2.4) T1(-8.8,-3.2) T2(-8,-3.2) T3(-7.2,-3.2) T4(-6.4,-3.2) T5(-5.6,-3.2) T6(-4.8,-3.2) T7(-4,-3.2) T8(-3.2,-3.2) T9(-2.4,-3.2) T10(-1.6,-3.2) T11(-0.8,-3.2) T12(0,-3.2) T13(0.8,-3.2) T14(1.6,-3.2) T15(2.4,-3.2) T16(3.2,-3.2) T17(4,-3.2) T18(4.8,-3.2) T19(5.6,-3.2) T20(6.4,-3.2) T21(7.2,-3.2) T22(8,-3.2) T23(8.8,-3.2) U1(-8.8,-4) U2(-8,-4) U3(-7.2,-4) U4(-6.4,-4) U5(-5.6,-4) U6(-4.8,-4) U7(-4,-4) U8(-3.2,-4) U9(-2.4,-4) U10(-1.6,-4) U11(-0.8,-4) U12(0,-4) U13(0.8,-4) U14(1.6,-4) U15(2.4,-4) U16(3.2,-4) U17(4,-4) U18(4.8,-4) U19(5.6,-4) U20(6.4,-4) U21(7.2,-4) U22(8,-4) U23(8.8,-4) V1(-8.8,-4.8) V2(-8,-4.8) V3(-7.2,-4.8) V4(-6.4,-4.8) V5(-5.6,-4.8) V6(-4.8,-4.8) V7(-4,-4.8) V8(-3.2,-4.8) V9(-2.4,-4.8) V10(-1.6,-4.8) V11(-0.8,-4.8) V12(0,-4.8) V13(0.8,-4.8) V14(1.6,-4.8) V15(2.4,-4.8) V16(3.2,-4.8) V17(4,-4.8) V18(4.8,-4.8) V19(5.6,-4.8) V20(6.4,-4.8) V21(7.2,-4.8) V22(8,-4.8) V23(8.8,-4.8) W1(-8.8,-5.6) W2(-8,-5.6) W3(-7.2,-5.6) W4(-6.4,-5.6) W5(-5.6,-5.6) W6(-4.8,-5.6) W7(-4,-5.6) W8(-3.2,-5.6) W9(-2.4,-5.6) W10(-1.6,-5.6) W11(-0.8,-5.6) W12(0,-5.6) W13(0.8,-5.6) W14(1.6,-5.6) W15(2.4,-5.6) W16(3.2,-5.6) W17(4,-5.6) W18(4.8,-5.6) W19(5.6,-5.6) W20(6.4,-5.6) W21(7.2,-5.6) W22(8,-5.6) W23(8.8,-5.6) Y1(-8.8,-6.4) Y2(-8,-6.4) Y3(-7.2,-6.4) Y4(-6.4,-6.4) Y5(-5.6,-6.4) Y6(-4.8,-6.4) Y7(-4,-6.4) Y8(-3.2,-6.4) Y9(-2.4,-6.4) Y10(-1.6,-6.4) Y11(-0.8,-6.4) Y12(0,-6.4) Y13(0.8,-6.4) Y14(1.6,-6.4) Y15(2.4,-6.4) Y16(3.2,-6.4) Y17(4,-6.4) Y18(4.8,-6.4) Y19(5.6,-6.4) Y20(6.4,-6.4) Y21(7.2,-6.4) Y22(8,-6.4) Y23(8.8,-6.4)
Top Overlay:
  circle w0.25: c-10.25,8.8 r0.125
  region: -8.849,9.6 -9.6,8.849 -9.6,9.6
  lines w0.2: -9.6,8.849 -8.849,9.6 ; -9.6,-9.6 9.6,-9.6 9.6,9.6 -9.6,9.6 -9.6,-9.6
Mechanical 13:
  lines w0.1: -9.6,-9.6 9.6,-9.6 9.6,9.6 -9.6,9.6 -9.6,-9.6
Mechanical 15:
  lines w0.1: -0.5,0 0.5,0 ; 0,-0.5 0,0.5 ; -10.6,-10.6 10.6,-10.6 10.6,10.6 -10.6,10.6 -10.6,-10.6
3D body: height 1.6, standoff 0.2, extent -9.6,-9.6 9.6,9.6

## BGA_139_7*7 [mil]
pads (139):
  round 10 smd: A1(-118.11,118.11) A2(-98.43,118.11) A3(-78.74,118.11) A4(-59.06,118.11) A5(-39.37,118.11) A6(-19.69,118.11) A7(0,118.11) A8(19.69,118.11) A9(39.37,118.11) A10(59.06,118.11) A11(78.74,118.11) A12(98.43,118.11) A13(118.11,118.11) B1(-118.11,98.43) B2(-98.43,98.43) B3(-78.74,98.43) B4(-59.06,98.43) B5(-39.37,98.43) B6(-19.69,98.43) B7(0,98.43) B8(19.69,98.43) B9(39.37,98.43) B10(59.06,98.43) B11(78.74,98.43) B12(98.43,98.43) B13(118.11,98.43) C1(-118.11,78.74) C2(-98.43,78.74) C12(98.43,78.74) C13(118.11,78.74) D1(-118.11,59.06) D2(-98.43,59.06) D4(-59.06,59.06) D5(-39.37,59.06) D6(-19.69,59.06) D7(0,59.06) D8(19.69,59.06) D9(39.37,59.06) D10(59.06,59.06) D12(98.43,59.06) D13(118.11,59.06) E1(-118.11,39.37) E2(-98.43,39.37) E4(-59.06,39.37) E5(-39.37,39.37) E6(-19.69,39.37) E7(0,39.37) E8(19.69,39.37) E9(39.37,39.37) E10(59.06,39.37) E11(78.74,39.37) E12(98.43,39.37) E13(118.11,39.37) F1(-118.11,19.69) F2(-98.43,19.69) F4(-59.06,19.69) F5(-39.37,19.69) F6(-19.69,19.69) F7(0,19.69) F8(19.69,19.69) F9(39.37,19.69) F10(59.06,19.69) F11(78.74,19.69) F12(98.43,19.69) F13(118.11,19.69) G1(-118.11,0) G2(-98.43,0) G4(-59.06,0) G5(-39.37,0) G6(-19.69,0) G7(0,0) G8(19.69,0) G9(39.37,0) G10(59.06,0) G12(98.43,0) G13(118.11,0) H1(-118.11,-19.69) H2(-98.43,-19.69) H4(-59.06,-19.69) H5(-39.37,-19.69) H6(-19.69,-19.69) H7(0,-19.69) H8(19.69,-19.69) H9(39.37,-19.69) H10(59.06,-19.69) H12(98.43,-19.69) H13(118.11,-19.69) J1(-118.11,-39.37) J2(-98.43,-39.37) J4(-59.06,-39.37) J5(-39.37,-39.37) J6(-19.69,-39.37) J7(0,-39.37) J8(19.69,-39.37) J9(39.37,-39.37) J10(59.06,-39.37) J12(98.43,-39.37) J13(118.11,-39.37) K1(-118.11,-59.06) K2(-98.43,-59.06) K4(-59.06,-59.06) K5(-39.37,-59.06) K6(-19.69,-59.06) K7(0,-59.06) K8(19.69,-59.06) K9(39.37,-59.06) K10(59.06,-59.06) K12(98.43,-59.06) K13(118.11,-59.06) L1(-118.11,-78.74) L2(-98.43,-78.74) L12(98.43,-78.74) L13(118.11,-78.74) M1(-118.11,-98.43) M2(-98.43,-98.43) M3(-78.74,-98.43) M4(-59.06,-98.43) M5(-39.37,-98.43) M6(-19.69,-98.43) M7(0,-98.43) M8(19.69,-98.43) M9(39.37,-98.43) M10(59.06,-98.43) M11(78.74,-98.43) M12(98.43,-98.43) M13(118.11,-98.43) N1(-118.11,-118.11) N2(-98.43,-118.11) N3(-78.74,-118.11) N4(-59.06,-118.11) N5(-39.37,-118.11) N6(-19.69,-118.11) N7(0,-118.11) N8(19.69,-118.11) N9(39.37,-118.11) N10(59.06,-118.11) N11(78.74,-118.11) N12(98.43,-118.11) N13(118.11,-118.11)
Top Overlay:
  lines w5: -141.73,-141.73 -141.73,122.05 -122.05,141.73 141.73,141.73 141.73,-141.73 -141.73,-141.73

## BH1750FVI [mm] "WSOF6I, 6-Leads,"
height 2.03
pads (6):
  oval 0.8x0.3 smd mask+0.05: 1(-1.4,0.525) 2(-1.4,0) 3(-1.4,-0.5) 4(1.4,-0.5) 5(1.4,0) 6(1.4,0.5)
Top Overlay:
  circle w0.1: c-1.4,0.9 r0.05
  lines w0.1: -0.787,-0.8 0.787,-0.8 0.787,0.8 0.312,0.8 cw(c0,0.8) -0.312,0.8 -0.787,0.8 -0.787,-0.8
Mechanical 13:
  circle w0.1: c-0.675,0.525 r0.15
  lines w0.1: 1.4,0.8 1.4,-0.8 -1.4,-0.8 -1.4,0.8 1.4,0.8 ; 1.4,0.8 1.4,0.8
Mechanical 15:
  lines w0.1: -0.25,0 0.25,0 ; 0,-0.25 0,0.25 ; -1.95,-1.05 1.95,-1.05 1.95,1.075 -1.95,1.075 -1.95,-1.05
3D body: height 0.5, standoff 0, extent -1.4,-0.8 1.4,0.8

## BQ27541 [mm]
pads (16):
  rect 0.2x0.85 smd: 1(-1,2) 2(-0.6,2) 3(-0.2,2) 4(0.2,2) 5(0.6,2) 6(1,2) 7(1,-2) 8(0.6,-2) 9(0.2,-2) 10(-0.2,-2) 11(-0.6,-2) 12(-1,-2)
  rect 0.85x0.25 smd: 6(-1.2,-1.1) 6(-1.2,1.1) 6(1.2,-1.1) 6(1.2,1.1)
Top Layer:
  rectangle: -1,-1.3 1,1.3
Top Overlay:
  circle w0.1: c-1.7,2 r0.1
  lines w0.1: -1.4,-1.3 -1.4,-2 -1.2,-2 ; -1.4,1.3 -1.4,2 -1.2,2 ; 1.2,-2 1.4,-2 1.4,-1.3 ; 1.2,2 1.4,2 1.4,1.3

## Bridge01 [mm] "SIP; 4 Leads; Body 15 x 17.5 x 6.8 mm (typ); Pitch 3.8 mm"
height 15
pads (4):
  rect 1.7x1.7 hole 1.1: 1(-5.7,0)
  round 1.7 hole 1.1: 2(-1.9,0) 3(1.9,0) 4(5.7,0)
Top Overlay:
  lines w0.2: -8.75,2.9 8.75,2.9 ; -8.75,-3.4 -8.75,3.4 8.75,3.4 8.75,-3.4 -8.75,-3.4
  text "~" at -2.27,-3.94 h1.02
  text "~" at 1.6,-3.94 h1.02
  text "+" at -6.18,-3.08 h1.02
  text "-" at 5.32,-3.19 h1.02

## BUZZMINI [mil]
height 24.02
pads (2):
  round 62 hole 32: 1(0,0) 2(200,0)
Top Overlay:
  circle w10: c100,0 r181.1
  lines w12: -25,-85 25,-85 ; 0,-110 0,-60

## C3528 [mil]
pads (2):
  rect 75x90 smd: 1(0,0) 2(-135,0)
Top Overlay:
  lines w12: -155.63,-53.03 -155.63,-65 -90,-65 ; -155.63,53.03 -155.63,65 -90,65 ; -97.99,-65 5.63,-65 19.45,-51.18 ; -94.06,65 5.63,65 19.45,51.18 ; -51.18,-65 -51.18,65

## C6032/1812 [mm]
pads (2):
  rect 2.6x2.2 smd: 1(-2.4,0) 2(2.4,0)
Top Overlay:
  lines w0.2: -2.4,-1.35 -2,-1.75 3.15,-1.75 3.15,-1.35 ; -2.4,1.35 -2,1.75 3.15,1.75 3.15,1.35 ; -0.8,-1.75 -0.8,1.75

## C7343 [mm] "Capacitor, SM Tantalum; Body 7.3 x 4.3 mm (LxW typ)"
height 3.7
pads (2):
  rect 2.6x2.4 smd: 1(-3.2,0) 2(3.2,0)
Top Overlay:
  lines w0.2: -3.9,-1.4 -3.9,-1.7 -3.3,-2.3 -3,-2.3 3.8,-2.3 ; -3.9,1.4 -3.9,1.7 -3.3,2.3 -3.1,2.3 3.8,2.3 ; -1.5,-2.3 -1.5,2.3 ; 3.8,-2.25 3.8,-2.3 ; 3.8,-1.4 3.8,-2.3 ; 3.8,1.4 3.8,2.3 ; 3.8,2.25 3.8,2.3

## C-6.3*5.5 [mm]
pads (2):
  rect 1.3x3.2 smd: 1(0,0) 2(0,4.8)
Top Overlay:
  lines w0.2: -3.3,1.4 -3.3,0.3 ; -2.4,3.8 -2.4,5 ; -0.9,-1.1 -1.9,-1.1 -3.3,0.3 ; -0.9,5.9 -3.3,5.9 -3.3,0.3 ; 0.9,-1.1 1.9,-1.1 3.3,0.3 3.3,5.9 0.9,5.9

## C-8*10.2 [mm]
pads (2):
  rect 3.4x1.6 smd: 1(-3.2,0) 2(3.3,0)
Top Overlay:
  lines w0.254: -4.244,-0.909 -4.244,-2.609 -2.544,-4.309 4.356,-4.309 4.356,-0.909 ; -4.244,0.891 -4.244,2.591 -2.544,4.291 4.356,4.291 4.356,0.891 ; 2.256,3.091 3.456,3.091

## C-LC [mm]
pads (2):
  rect 4x1.6 smd: 1(-3.494,-0.009) 2(3.506,-0.009)
Top Overlay:
  lines w0.254: -4.294,-0.909 -4.294,-2.609 -2.594,-4.309 4.306,-4.309 4.306,-0.909 ; -4.294,0.891 -4.294,2.591 -2.594,4.291 4.306,4.291 4.306,0.891 ; 2.206,3.091 3.406,3.091

## CAP-5mm*10mmm [mm]
pads (2):
  rect 1.5x1.5 hole 0.9: 1(0,0)
  round 1.5 hole 0.9: 2(5,0)
Top Overlay:
  circle w0.2: c2.5,0 r5
  text "+" at -3.975,-0.75 h1.5